# Altium footprint library ICs And Semiconductors SMD.PcbLib: 943 footprints (part 45 of 60)
Each footprint in its own frame and in the unit in brackets; x right, y up, seen from the top. Pads: shape width x height; smd on the part's side, far side on the other; paste and mask are expansions set on the pad; w line width, h text height; cw(c..) or ccw(c..) is an arc to the next point about the centre after c.
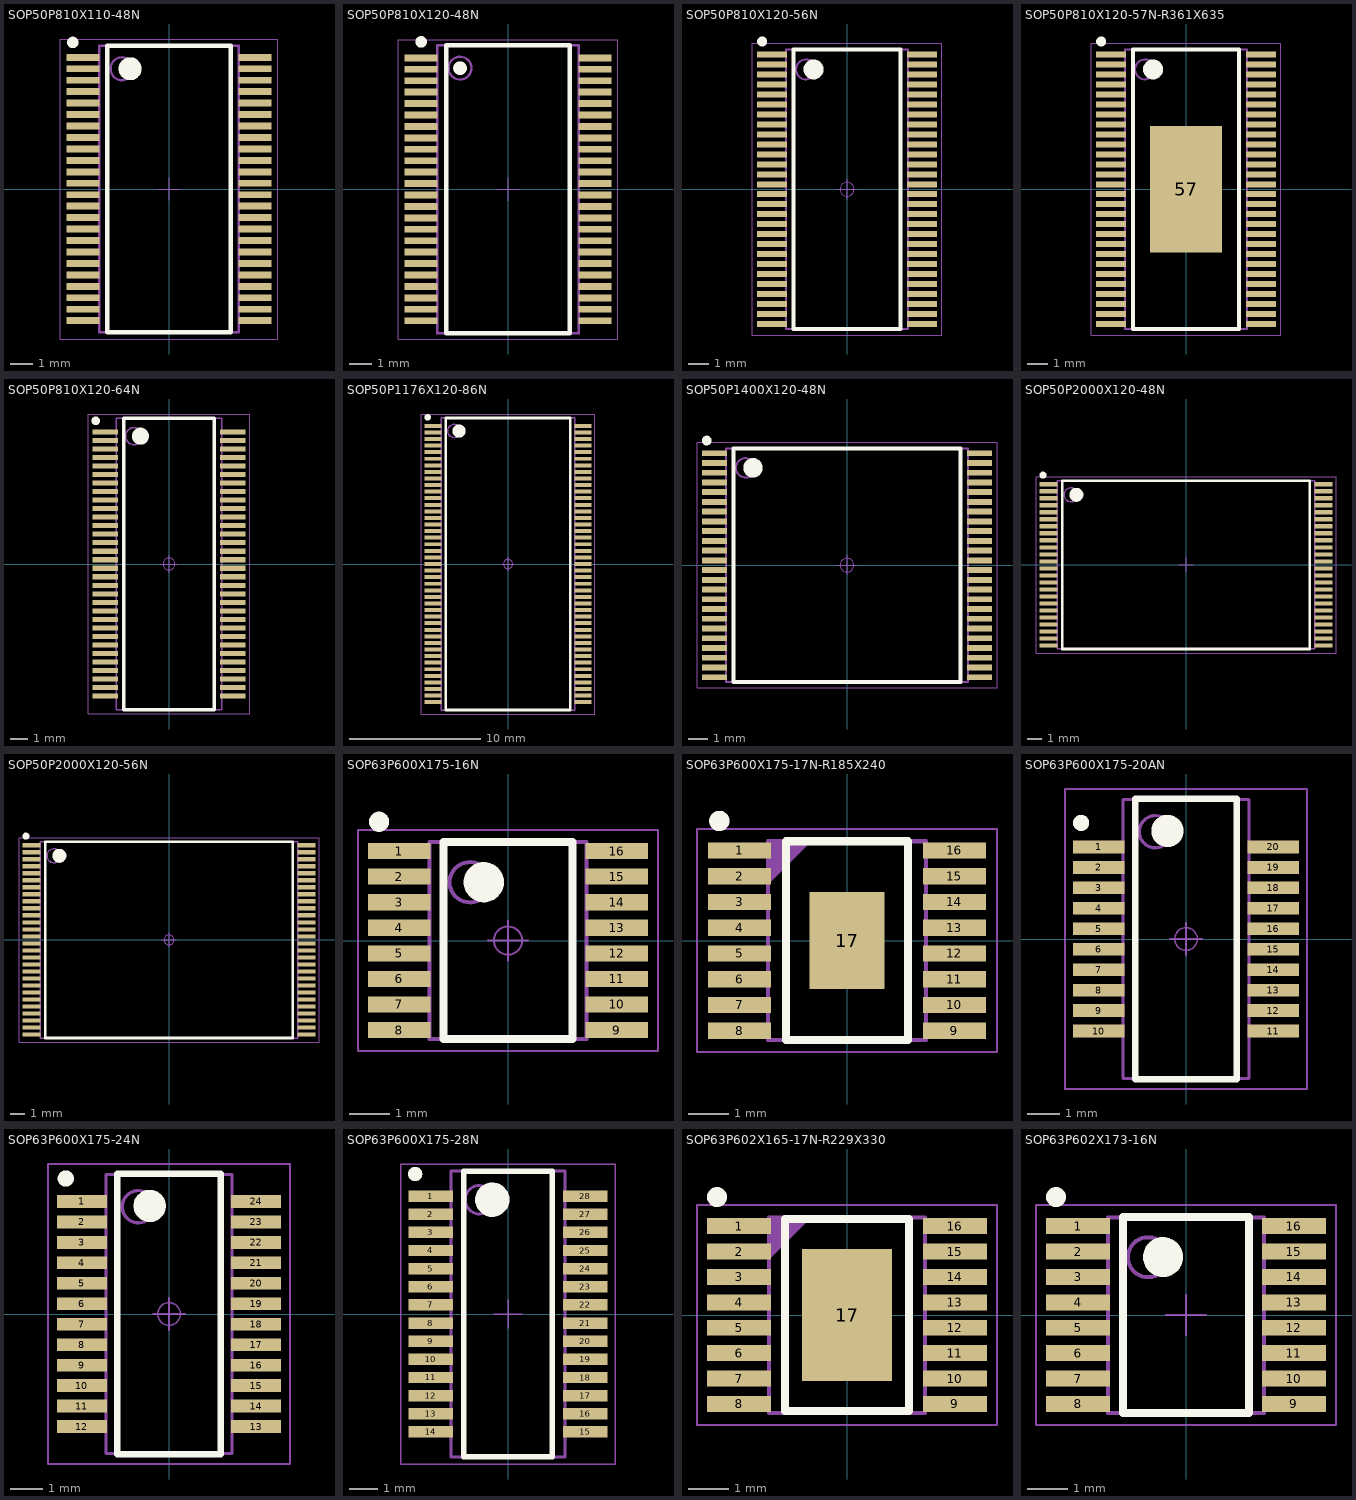
[diagram p44: the footprints below, top view; thin cyan lines are the x and y axes]

## SOP50P810X110-48N [mm] "SOP, 48-Leads, Body 12.5x6.2mm (max), Pitch 0.50mm, IPC Medium Density"
height 1.1
pads (48):
  rect 1.45x0.3 smd: 1(-3.75,5.75) 2(-3.75,5.25) 3(-3.75,4.75) 4(-3.75,4.25) 5(-3.75,3.75) 6(-3.75,3.25) 7(-3.75,2.75) 8(-3.75,2.25) 9(-3.75,1.75) 10(-3.75,1.25) 11(-3.75,0.75) 12(-3.75,0.25) 13(-3.75,-0.25) 14(-3.75,-0.75) 15(-3.75,-1.25) 16(-3.75,-1.75) 17(-3.75,-2.25) 18(-3.75,-2.75) 19(-3.75,-3.25) 20(-3.75,-3.75) 21(-3.75,-4.25) 22(-3.75,-4.75) 23(-3.75,-5.25) 24(-3.75,-5.75) 25(3.75,-5.75) 26(3.75,-5.25) 27(3.75,-4.75) 28(3.75,-4.25) 29(3.75,-3.75) 30(3.75,-3.25) 31(3.75,-2.75) 32(3.75,-2.25) 33(3.75,-1.75) 34(3.75,-1.25) 35(3.75,-0.75) 36(3.75,-0.25) 37(3.75,0.25) 38(3.75,0.75) 39(3.75,1.25) 40(3.75,1.75) 41(3.75,2.25) 42(3.75,2.75) 43(3.75,3.25) 44(3.75,3.75) 45(3.75,4.25) 46(3.75,4.75) 47(3.75,5.25) 48(3.75,5.75)
Top Overlay:
  circle w0.5: c-1.7,5.25 r0.25
  circle w0.25: c-4.2,6.4 r0.125
  lines w0.2: -2.7,-6.25 2.7,-6.25 2.7,6.25 -2.7,6.25 -2.7,-6.25
Mechanical 14:
  circle w0.1: c-2.05,5.25 r0.5
  lines w0.1: -3.05,-6.25 -3.05,6.25 3.05,6.25 3.05,-6.25 -3.05,-6.25
Mechanical 15:
  lines w0.05: -0.5,0 0.5,0 ; 0,-0.5 0,0.5 ; -4.75,-6.55 -4.75,6.55 4.75,6.55 4.75,-6.55 -4.75,-6.55
3D body "SOP50P810X110-48N.stp": height 1.1, standoff 0, extent -4.06,-6.3 4.061,6.3

## SOP50P810X120-48N [mm] "SOP, 48-Leads, Body 12.6x6.2mm (max), Pitch 0.50mm, IPC Medium Density"
height 1.2
pads (48):
  rect 1.45x0.3 smd: 1(-3.8,5.75) 2(-3.8,5.25) 3(-3.8,4.75) 4(-3.8,4.25) 5(-3.8,3.75) 6(-3.8,3.25) 7(-3.8,2.75) 8(-3.8,2.25) 9(-3.8,1.75) 10(-3.8,1.25) 11(-3.8,0.75) 12(-3.8,0.25) 13(-3.8,-0.25) 14(-3.8,-0.75) 15(-3.8,-1.25) 16(-3.8,-1.75) 17(-3.8,-2.25) 18(-3.8,-2.75) 19(-3.8,-3.25) 20(-3.8,-3.75) 21(-3.8,-4.25) 22(-3.8,-4.75) 23(-3.8,-5.25) 24(-3.8,-5.75) 25(3.8,-5.75) 26(3.8,-5.25) 27(3.8,-4.75) 28(3.8,-4.25) 29(3.8,-3.75) 30(3.8,-3.25) 31(3.8,-2.75) 32(3.8,-2.25) 33(3.8,-1.75) 34(3.8,-1.25) 35(3.8,-0.75) 36(3.8,-0.25) 37(3.8,0.25) 38(3.8,0.75) 39(3.8,1.25) 40(3.8,1.75) 41(3.8,2.25) 42(3.8,2.75) 43(3.8,3.25) 44(3.8,3.75) 45(3.8,4.25) 46(3.8,4.75) 47(3.8,5.25) 48(3.8,5.75)
Top Overlay:
  circle w0.3: c-2.1,5.3 r0.15
  circle w0.25: c-3.8,6.45 r0.125
  lines w0.2: -2.7,-6.3 -2.7,6.3 2.7,6.3 2.7,-6.3 -2.7,-6.3
Mechanical 14:
  circle w0.1: c-2.1,5.3 r0.5
  lines w0.1: -3.1,-6.3 -3.1,6.3 3.1,6.3 3.1,-6.3 -3.1,-6.3
Mechanical 15:
  lines w0.05: -0.5,0 0.5,0 ; 0,-0.5 0,0.5 ; -4.8,-6.55 -4.8,6.55 4.8,6.55 4.8,-6.55 -4.8,-6.55
3D body "SOP50P810X120-48N.stp": height 1.2, standoff 0, extent -4.06,-6.3 4.061,6.3

## SOP50P810X120-56N [mm] "SOP, 0.50mm Pitch; 56 Pin,6.10mm W X 14.00mm L X 1.20mm H Body, IPC Medium Density"
height 1.2
pads (56):
  rect 1.5x0.3 smd: 1(-3.75,6.75) 2(-3.75,6.25) 3(-3.75,5.75) 4(-3.75,5.25) 5(-3.75,4.75) 6(-3.75,4.25) 7(-3.75,3.75) 8(-3.75,3.25) 9(-3.75,2.75) 10(-3.75,2.25) 11(-3.75,1.75) 12(-3.75,1.25) 13(-3.75,0.75) 14(-3.75,0.25) 15(-3.75,-0.25) 16(-3.75,-0.75) 17(-3.75,-1.25) 18(-3.75,-1.75) 19(-3.75,-2.25) 20(-3.75,-2.75) 21(-3.75,-3.25) 22(-3.75,-3.75) 23(-3.75,-4.25) 24(-3.75,-4.75) 25(-3.75,-5.25) 26(-3.75,-5.75) 27(-3.75,-6.25) 28(-3.75,-6.75) 29(3.75,-6.75) 30(3.75,-6.25) 31(3.75,-5.75) 32(3.75,-5.25) 33(3.75,-4.75) 34(3.75,-4.25) 35(3.75,-3.75) 36(3.75,-3.25) 37(3.75,-2.75) 38(3.75,-2.25) 39(3.75,-1.75) 40(3.75,-1.25) 41(3.75,-0.75) 42(3.75,-0.25) 43(3.75,0.25) 44(3.75,0.75) 45(3.75,1.25) 46(3.75,1.75) 47(3.75,2.25) 48(3.75,2.75) 49(3.75,3.25) 50(3.75,3.75) 51(3.75,4.25) 52(3.75,4.75) 53(3.75,5.25) 54(3.75,5.75) 55(3.75,6.25) 56(3.75,6.75)
Top Overlay:
  circle w0.5: c-1.675,6 r0.25
  circle w0.25: c-4.25,7.4 r0.125
  lines w0.2: -2.675,-7 2.675,-7 2.675,7 -2.675,7 -2.675,-7
Mechanical 14:
  circle w0.1: c-2.05,6 r0.5
  lines w0.1: -3.05,-7 3.05,-7 3.05,7 -3.05,7 -3.05,-7
Mechanical 15:
  circle w0.05: c0,0 r0.35
  lines w0.05: -0.5,0 0.5,0 ; 0,-0.5 0,0.5 ; -4.75,-7.3 4.75,-7.3 4.75,7.3 -4.75,7.3 -4.75,-7.3
3D body "SOP50P810X120-56N.stp": height 1.2, standoff 0, extent -4.06,-7.05 4.061,7.05

## SOP50P810X120-57N-R361X635 [mm] "SOP, 0.50mm Pitch; 56 Pin,6.10mm W X 14.00mm L X 1.20mm H Body (w/Termal Tab  3.61 X 6.35mm), IPC Medium Density"
height 1.2
pads (57):
  rect 1.5x0.3 smd: 1(-3.75,6.75) 2(-3.75,6.25) 3(-3.75,5.75) 4(-3.75,5.25) 5(-3.75,4.75) 6(-3.75,4.25) 7(-3.75,3.75) 8(-3.75,3.25) 9(-3.75,2.75) 10(-3.75,2.25) 11(-3.75,1.75) 12(-3.75,1.25) 13(-3.75,0.75) 14(-3.75,0.25) 15(-3.75,-0.25) 16(-3.75,-0.75) 17(-3.75,-1.25) 18(-3.75,-1.75) 19(-3.75,-2.25) 20(-3.75,-2.75) 21(-3.75,-3.25) 22(-3.75,-3.75) 23(-3.75,-4.25) 24(-3.75,-4.75) 25(-3.75,-5.25) 26(-3.75,-5.75) 27(-3.75,-6.25) 28(-3.75,-6.75) 29(3.75,-6.75) 30(3.75,-6.25) 31(3.75,-5.75) 32(3.75,-5.25) 33(3.75,-4.75) 34(3.75,-4.25) 35(3.75,-3.75) 36(3.75,-3.25) 37(3.75,-2.75) 38(3.75,-2.25) 39(3.75,-1.75) 40(3.75,-1.25) 41(3.75,-0.75) 42(3.75,-0.25) 43(3.75,0.25) 44(3.75,0.75) 45(3.75,1.25) 46(3.75,1.75) 47(3.75,2.25) 48(3.75,2.75) 49(3.75,3.25) 50(3.75,3.75) 51(3.75,4.25) 52(3.75,4.75) 53(3.75,5.25) 54(3.75,5.75) 55(3.75,6.25) 56(3.75,6.75)
  rect 3.61x6.35 smd: 57(0,0)
Top Overlay:
  circle w0.25: c-4.25,7.4 r0.125
  circle w0.5: c-1.65,6 r0.25
  lines w0.2: -2.65,-7 2.65,-7 2.65,7 -2.65,7 -2.65,-7
Top Paste:
  region: -0.97,-2.62 0.97,-2.62 0.97,-0.28 -0.97,-0.28
  region: -0.97,0.28 0.97,0.28 0.97,2.62 -0.97,2.62
Mechanical 14:
  circle w0.1: c-2.05,6 r0.5
  lines w0.1: -3.05,-7 3.05,-7 3.05,7 -3.05,7 -3.05,-7
Mechanical 15:
  circle w0.05: c0,0 r0.35
  lines w0.05: -0.5,0 0.5,0 ; 0,-0.5 0,0.5 ; -4.75,-7.3 4.75,-7.3 4.75,7.3 -4.75,7.3 -4.75,-7.3
3D body "SOP50P810X120-57N-R361X635.stp": height 1.2, standoff 0, extent -4.06,-7.05 4.061,7.05

## SOP50P810X120-64N [mm] "SOP, 0.50mm Pitch; 64 Pin,6.10mm W X 17.00mm L X 1.20mm H Body, IPC Medium Density"
height 1.2
pads (64):
  rect 1.5x0.3 smd: 1(-3.75,7.75) 2(-3.75,7.25) 3(-3.75,6.75) 4(-3.75,6.25) 5(-3.75,5.75) 6(-3.75,5.25) 7(-3.75,4.75) 8(-3.75,4.25) 9(-3.75,3.75) 10(-3.75,3.25) 11(-3.75,2.75) 12(-3.75,2.25) 13(-3.75,1.75) 14(-3.75,1.25) 15(-3.75,0.75) 16(-3.75,0.25) 17(-3.75,-0.25) 18(-3.75,-0.75) 19(-3.75,-1.25) 20(-3.75,-1.75) 21(-3.75,-2.25) 22(-3.75,-2.75) 23(-3.75,-3.25) 24(-3.75,-3.75) 25(-3.75,-4.25) 26(-3.75,-4.75) 27(-3.75,-5.25) 28(-3.75,-5.75) 29(-3.75,-6.25) 30(-3.75,-6.75) 31(-3.75,-7.25) 32(-3.75,-7.75) 33(3.75,-7.75) 34(3.75,-7.25) 35(3.75,-6.75) 36(3.75,-6.25) 37(3.75,-5.75) 38(3.75,-5.25) 39(3.75,-4.75) 40(3.75,-4.25) 41(3.75,-3.75) 42(3.75,-3.25) 43(3.75,-2.75) 44(3.75,-2.25) 45(3.75,-1.75) 46(3.75,-1.25) 47(3.75,-0.75) 48(3.75,-0.25) 49(3.75,0.25) 50(3.75,0.75) 51(3.75,1.25) 52(3.75,1.75) 53(3.75,2.25) 54(3.75,2.75) 55(3.75,3.25) 56(3.75,3.75) 57(3.75,4.25) 58(3.75,4.75) 59(3.75,5.25) 60(3.75,5.75) 61(3.75,6.25) 62(3.75,6.75) 63(3.75,7.25) 64(3.75,7.75)
Top Overlay:
  circle w0.25: c-4.3,8.4 r0.125
  circle w0.5: c-1.675,7.5 r0.25
  lines w0.2: -2.65,-8.55 -2.65,8.55 2.65,8.55 2.65,-8.55 -2.65,-8.55
Mechanical 14:
  circle w0.1: c-2.05,7.5 r0.5
  lines w0.1: -3.1,-8.55 3.1,-8.55 3.1,8.55 -3.1,8.55 -3.1,-8.55
Mechanical 15:
  circle w0.05: c0,0 r0.35
  lines w0.05: -0.5,0 0.5,0 ; 0,-0.5 0,0.5 ; -4.75,-8.8 4.75,-8.8 4.75,8.8 -4.75,8.8 -4.75,-8.8
3D body "SOP50P810X120-64N.stp": height 1.2, standoff 0, extent -4.06,-8.55 4.061,8.55

## SOP50P1176X120-86N [mm] "SOP, 0.50mm, pitch; 86 pin, 10.16mm W X 22.22mm L X 1.20mm H body, IPC Medium Density"
height 1.2
pads (86):
  rect 1.3x0.3 smd: 1(-5.7,10.5) 2(-5.7,10) 3(-5.7,9.5) 4(-5.7,9) 5(-5.7,8.5) 6(-5.7,8) 7(-5.7,7.5) 8(-5.7,7) 9(-5.7,6.5) 10(-5.7,6) 11(-5.7,5.5) 12(-5.7,5) 13(-5.7,4.5) 14(-5.7,4) 15(-5.7,3.5) 16(-5.7,3) 17(-5.7,2.5) 18(-5.7,2) 19(-5.7,1.5) 20(-5.7,1) 21(-5.7,0.5) 22(-5.7,0) 23(-5.7,-0.5) 24(-5.7,-1) 25(-5.7,-1.5) 26(-5.7,-2) 27(-5.7,-2.5) 28(-5.7,-3) 29(-5.7,-3.5) 30(-5.7,-4) 31(-5.7,-4.5) 32(-5.7,-5) 33(-5.7,-5.5) 34(-5.7,-6) 35(-5.7,-6.5) 36(-5.7,-7) 37(-5.7,-7.5) 38(-5.7,-8) 39(-5.7,-8.5) 40(-5.7,-9) 41(-5.7,-9.5) 42(-5.7,-10) 43(-5.7,-10.5) 44(5.7,-10.5) 45(5.7,-10) 46(5.7,-9.5) 47(5.7,-9) 48(5.7,-8.5) 49(5.7,-8) 50(5.7,-7.5) 51(5.7,-7) 52(5.7,-6.5) 53(5.7,-6) 54(5.7,-5.5) 55(5.7,-5) 56(5.7,-4.5) 57(5.7,-4) 58(5.7,-3.5) 59(5.7,-3) 60(5.7,-2.5) 61(5.7,-2) 62(5.7,-1.5) 63(5.7,-1) 64(5.7,-0.5) 65(5.7,0) 66(5.7,0.5) 67(5.7,1) 68(5.7,1.5) 69(5.7,2) 70(5.7,2.5) 71(5.7,3) 72(5.7,3.5) 73(5.7,4) 74(5.7,4.5) 75(5.7,5) 76(5.7,5.5) 77(5.7,6) 78(5.7,6.5) 79(5.7,7) 80(5.7,7.5) 81(5.7,8) 82(5.7,8.5) 83(5.7,9) 84(5.7,9.5) 85(5.7,10) 86(5.7,10.5)
Top Overlay:
  circle w0.5: c-3.725,10.1 r0.25
  circle w0.25: c-6.1,11.15 r0.125
  lines w0.2: -4.725,-11.1 4.725,-11.1 4.725,11.1 -4.725,11.1 -4.725,-11.1
Mechanical 14:
  circle w0.1: c-4.08,10.11 r0.5
  lines w0.1: -5.08,-11.11 5.08,-11.11 5.08,11.11 -5.08,11.11 -5.08,-11.11
Mechanical 15:
  circle w0.05: c0,0 r0.35
  lines w0.05: -0.5,0 0.5,0 ; 0,-0.5 0,0.5 ; -6.6,-11.4 6.6,-11.4 6.6,11.4 -6.6,11.4 -6.6,-11.4
3D body "SOP50P1176X120-86N.stp": height 1.2, standoff 0, extent -5.97,-11.15 5.97,11.15

## SOP50P1400X120-48N [mm] "SOP, 0.50mm Pitch; 48 Pin, 12.40mm W X 12.00mm L X 1.20mm H body, IPC Medium Density"
height 1.2
pads (48):
  rect 1.3x0.3 smd: 1(-6.8,5.75) 2(-6.8,5.25) 3(-6.8,4.75) 4(-6.8,4.25) 5(-6.8,3.75) 6(-6.8,3.25) 7(-6.8,2.75) 8(-6.8,2.25) 9(-6.8,1.75) 10(-6.8,1.25) 11(-6.8,0.75) 12(-6.8,0.25) 13(-6.8,-0.25) 14(-6.8,-0.75) 15(-6.8,-1.25) 16(-6.8,-1.75) 17(-6.8,-2.25) 18(-6.8,-2.75) 19(-6.8,-3.25) 20(-6.8,-3.75) 21(-6.8,-4.25) 22(-6.8,-4.75) 23(-6.8,-5.25) 24(-6.8,-5.75) 25(6.8,-5.75) 26(6.8,-5.25) 27(6.8,-4.75) 28(6.8,-4.25) 29(6.8,-3.75) 30(6.8,-3.25) 31(6.8,-2.75) 32(6.8,-2.25) 33(6.8,-1.75) 34(6.8,-1.25) 35(6.8,-0.75) 36(6.8,-0.25) 37(6.8,0.25) 38(6.8,0.75) 39(6.8,1.25) 40(6.8,1.75) 41(6.8,2.25) 42(6.8,2.75) 43(6.8,3.25) 44(6.8,3.75) 45(6.8,4.25) 46(6.8,4.75) 47(6.8,5.25) 48(6.8,5.75)
Top Overlay:
  circle w0.5: c-4.825,5 r0.25
  circle w0.25: c-7.2,6.4 r0.125
  lines w0.2: -5.825,-6 5.825,-6 5.825,6 -5.825,6 -5.825,-6
Mechanical 14:
  circle w0.1: c-5.2,5 r0.5
  lines w0.1: -6.2,-6 6.2,-6 6.2,6 -6.2,6 -6.2,-6
Mechanical 15:
  circle w0.05: c0,0 r0.35
  lines w0.05: -0.5,0 0.5,0 ; 0,-0.5 0,0.5 ; -7.7,-6.3 7.7,-6.3 7.7,6.3 -7.7,6.3 -7.7,-6.3
3D body "SOP50P1400X120-48N.stp": height 1.2, standoff 0, extent -7.061,-6 7.061,6

## SOP50P2000X120-48N [mm] "SOP, 48-Leads, Body 18.45x12mm, Pitch 0.50mm, IPC Medium Density"
height 1.2
pads (48):
  rect 1.3x0.3 smd: 1(-9.8,5.75) 2(-9.8,5.25) 3(-9.8,4.75) 4(-9.8,4.25) 5(-9.8,3.75) 6(-9.8,3.25) 7(-9.8,2.75) 8(-9.8,2.25) 9(-9.8,1.75) 10(-9.8,1.25) 11(-9.8,0.75) 12(-9.8,0.25) 13(-9.8,-0.25) 14(-9.8,-0.75) 15(-9.8,-1.25) 16(-9.8,-1.75) 17(-9.8,-2.25) 18(-9.8,-2.75) 19(-9.8,-3.25) 20(-9.8,-3.75) 21(-9.8,-4.25) 22(-9.8,-4.75) 23(-9.8,-5.25) 24(-9.8,-5.75) 25(9.8,-5.75) 26(9.8,-5.25) 27(9.8,-4.75) 28(9.8,-4.25) 29(9.8,-3.75) 30(9.8,-3.25) 31(9.8,-2.75) 32(9.8,-2.25) 33(9.8,-1.75) 34(9.8,-1.25) 35(9.8,-0.75) 36(9.8,-0.25) 37(9.8,0.25) 38(9.8,0.75) 39(9.8,1.25) 40(9.8,1.75) 41(9.8,2.25) 42(9.8,2.75) 43(9.8,3.25) 44(9.8,3.75) 45(9.8,4.25) 46(9.8,4.75) 47(9.8,5.25) 48(9.8,5.75)
Top Overlay:
  circle w0.25: c-10.2,6.4 r0.125
  circle w0.5: c-7.825,5 r0.25
  lines w0.2: -8.825,-6 -8.825,6 8.825,6 8.825,-6 -8.825,-6
Mechanical 14:
  circle w0.1: c-8.2,5 r0.5
  lines w0.1: -9.2,-6 9.2,-6 9.2,6 -9.2,6 -9.2,-6
Mechanical 15:
  lines w0.05: -0.5,0 0.5,0 ; 0,-0.5 0,0.5 ; -10.7,-6.3 10.7,-6.3 10.7,6.3 -10.7,6.3 -10.7,-6.3
3D body "SOP50P2000X120-48N.stp": height 1.2, standoff 0, extent -10.12,-6.05 10.121,6.05

## SOP50P2000X120-56N [mm] "SOP, 0.50mm, Pitch; 56 Pin, 18.40mm W X 14.00mm L X 1.20mm H body, IPC Medium Density"
height 1.2
pads (56):
  rect 1.3x0.3 smd: 1(-9.8,6.75) 2(-9.8,6.25) 3(-9.8,5.75) 4(-9.8,5.25) 5(-9.8,4.75) 6(-9.8,4.25) 7(-9.8,3.75) 8(-9.8,3.25) 9(-9.8,2.75) 10(-9.8,2.25) 11(-9.8,1.75) 12(-9.8,1.25) 13(-9.8,0.75) 14(-9.8,0.25) 15(-9.8,-0.25) 16(-9.8,-0.75) 17(-9.8,-1.25) 18(-9.8,-1.75) 19(-9.8,-2.25) 20(-9.8,-2.75) 21(-9.8,-3.25) 22(-9.8,-3.75) 23(-9.8,-4.25) 24(-9.8,-4.75) 25(-9.8,-5.25) 26(-9.8,-5.75) 27(-9.8,-6.25) 28(-9.8,-6.75) 29(9.8,-6.75) 30(9.8,-6.25) 31(9.8,-5.75) 32(9.8,-5.25) 33(9.8,-4.75) 34(9.8,-4.25) 35(9.8,-3.75) 36(9.8,-3.25) 37(9.8,-2.75) 38(9.8,-2.25) 39(9.8,-1.75) 40(9.8,-1.25) 41(9.8,-0.75) 42(9.8,-0.25) 43(9.8,0.25) 44(9.8,0.75) 45(9.8,1.25) 46(9.8,1.75) 47(9.8,2.25) 48(9.8,2.75) 49(9.8,3.25) 50(9.8,3.75) 51(9.8,4.25) 52(9.8,4.75) 53(9.8,5.25) 54(9.8,5.75) 55(9.8,6.25) 56(9.8,6.75)
Top Overlay:
  circle w0.25: c-10.2,7.4 r0.125
  circle w0.5: c-7.825,6 r0.25
  lines w0.2: -8.825,-7 -8.825,7 8.825,7 8.825,-7 -8.825,-7
Mechanical 14:
  circle w0.1: c-8.2,6 r0.5
  lines w0.1: -9.2,-7 -9.2,7 9.2,7 9.2,-7 -9.2,-7
Mechanical 15:
  circle w0.05: c0,0 r0.35
  lines w0.05: -0.5,0 0.5,0 ; 0,-0.5 0,0.5 ; -10.7,-7.3 -10.7,7.3 10.7,7.3 10.7,-7.3 -10.7,-7.3
3D body "SOP50P2000X120-56N.stp": height 1.2, standoff 0, extent -10.12,-7.05 10.121,7.05

## SOP63P600X175-16N [mm] "SOP, 0.635mm pitch; 16 pin, 3.9mm W X 4.895mm L X 1.75mm H Body, IPC Medium Density"
height 1.75
pads (16):
  rect 1.55x0.4 smd: 1(-2.7,2.222) 2(-2.7,1.587) 3(-2.7,0.953) 4(-2.7,0.318) 5(-2.7,-0.318) 6(-2.7,-0.953) 7(-2.7,-1.587) 8(-2.7,-2.222) 9(2.7,-2.222) 10(2.7,-1.587) 11(2.7,-0.953) 12(2.7,-0.318) 13(2.7,0.318) 14(2.7,0.953) 15(2.7,1.587) 16(2.7,2.222)
Top Overlay:
  circle w0.25: c-3.2,2.95 r0.125
  circle w0.5: c-0.6,1.45 r0.25
  lines w0.2: -1.6,-2.45 -1.6,2.45 1.6,2.45 1.6,-2.45 -1.6,-2.45
Mechanical 14:
  circle w0.1: c-0.95,1.448 r0.5
  lines w0.1: -1.95,-2.448 -1.95,2.448 1.95,2.448 1.95,-2.448 -1.95,-2.448
Mechanical 15:
  circle w0.05: c0,0 r0.35
  lines w0.05: -0.5,0 0.5,0 ; 0,-0.5 0,0.5 ; -3.725,-2.745 -3.725,2.745 3.725,2.745 3.725,-2.745 -3.725,-2.745
3D body "SOP63P600X175-16N.stp": height 1.75, standoff 0, extent -3.127,-2.49 3.127,2.49

## SOP63P600X175-17N-R185X240 [mm] "SOP,0.635mm,pitch;16 pin,3.90mm W X 4.90mm L X 1.75mm H body (w/thermal tab 1.8mm X 2.4 mm), IPC Medium Density"
height 1.75
pads (17):
  rect 1.55x0.4 smd: 1(-2.65,2.222) 2(-2.65,1.587) 3(-2.65,0.953) 4(-2.65,0.318) 5(-2.65,-0.318) 6(-2.65,-0.953) 7(-2.65,-1.587) 8(-2.65,-2.222) 9(2.65,-2.222) 10(2.65,-1.587) 11(2.65,-0.953) 12(2.65,-0.318) 13(2.65,0.318) 14(2.65,0.953) 15(2.65,1.587) 16(2.65,2.222)
  rect 1.85x2.4 smd: 17(0,0)
Top Overlay:
  circle w0.25: c-3.15,2.95 r0.125
  lines w0.2: -1.5,-2.45 -1.5,2.45 1.5,2.45 1.5,-2.45 -1.5,-2.45
Mechanical 14:
  lines w0.1: -1.95,1.45 -0.95,2.45 ; -1.95,1.55 -1.05,2.45 ; -1.95,1.65 -1.15,2.45 ; -1.95,1.75 -1.25,2.45 ; -1.95,1.85 -1.35,2.45 ; -1.95,1.95 -1.45,2.45 ; -1.95,2.05 -1.55,2.45 ; -1.95,2.15 -1.65,2.45 ; -1.95,2.25 -1.75,2.45 ; -1.95,2.35 -1.85,2.45 ; -1.95,-2.45 -1.95,2.45 1.95,2.45 1.95,-2.45 -1.95,-2.45
Mechanical 15:
  circle w0.05: c0,0 r0.35
  lines w0.05: -0.5,0 0.5,0 ; 0,-0.5 0,0.5 ; -3.7,-2.75 -3.7,2.75 3.7,2.75 3.7,-2.75 -3.7,-2.75
3D body "SOP63P600X175-17N-R185X240.stp": height 1.75, standoff 0, extent -3.127,-2.49 3.127,2.49

## SOP63P600X175-20AN [mm] "SOP, 0.635mm Pitch; 20 Pin, 3.90mm W X 8.65mm L X 1.75mm H Body, IPC Medium Density"
height 1.75
pads (20):
  rect 1.6x0.4 smd: 1(-2.7,2.857) 2(-2.7,2.222) 3(-2.7,1.587) 4(-2.7,0.953) 5(-2.7,0.318) 6(-2.7,-0.318) 7(-2.7,-0.953) 8(-2.7,-1.587) 9(-2.7,-2.222) 10(-2.7,-2.857) 11(2.7,-2.857) 12(2.7,-2.222) 13(2.7,-1.587) 14(2.7,-0.953) 15(2.7,-0.318) 16(2.7,0.318) 17(2.7,0.953) 18(2.7,1.587) 19(2.7,2.222) 20(2.7,2.857)
Top Overlay:
  circle w0.5: c-0.575,3.35 r0.25
  circle w0.25: c-3.25,3.6 r0.125
  lines w0.2: -1.575,-4.35 1.575,-4.35 1.575,4.35 -1.575,4.35 -1.575,-4.35
Mechanical 14:
  circle w0.1: c-0.95,3.325 r0.5
  lines w0.1: -1.95,-4.325 1.95,-4.325 1.95,4.325 -1.95,4.325 -1.95,-4.325
Mechanical 15:
  circle w0.05: c0,0 r0.35
  lines w0.05: -0.5,0 0.5,0 ; 0,-0.5 0,0.5 ; -3.75,-4.65 3.75,-4.65 3.75,4.65 -3.75,4.65 -3.75,-4.65
3D body "SOP63P600X175-20AN.stp": height 1.75, standoff 0, extent -3.127,-4.37 3.127,4.37

## SOP63P600X175-24N [mm] "SOP, 0.635mm Pitch; 24 Pin, 3.90mm W X 8.65mm L X 1.75mm H Body, IPC Medium Density"
height 1.75
pads (24):
  rect 1.55x0.4 smd: 1(-2.7,3.492) 2(-2.7,2.857) 3(-2.7,2.222) 4(-2.7,1.587) 5(-2.7,0.953) 6(-2.7,0.318) 7(-2.7,-0.318) 8(-2.7,-0.953) 9(-2.7,-1.587) 10(-2.7,-2.222) 11(-2.7,-2.857) 12(-2.7,-3.492) 13(2.7,-3.492) 14(2.7,-2.857) 15(2.7,-2.222) 16(2.7,-1.587) 17(2.7,-0.953) 18(2.7,-0.318) 19(2.7,0.318) 20(2.7,0.953) 21(2.7,1.587) 22(2.7,2.222) 23(2.7,2.857) 24(2.7,3.492)
Top Overlay:
  circle w0.25: c-3.2,4.2 r0.125
  circle w0.5: c-0.6,3.35 r0.25
  lines w0.2: -1.6,-4.35 -1.6,4.35 1.6,4.35 1.6,-4.35 -1.6,-4.35
Mechanical 14:
  circle w0.1: c-0.95,3.325 r0.5
  lines w0.1: -1.95,-4.325 -1.95,4.325 1.95,4.325 1.95,-4.325 -1.95,-4.325
Mechanical 15:
  circle w0.05: c0,0 r0.35
  lines w0.05: -0.5,0 0.5,0 ; 0,-0.5 0,0.5 ; -3.75,-4.65 -3.75,4.65 3.75,4.65 3.75,-4.65 -3.75,-4.65
3D body "SOP63P600X175-24N.stp": height 1.75, standoff 0, extent -3.127,-4.37 3.127,4.37

## SOP63P600X175-28N [mm] "SOP, 0.635mm pitch, 28 pin,3.99mm W X 10.00mm L X 1.75mm H body, IPC Medium Density"
height 1.75
pads (28):
  rect 1.55x0.4 smd: 1(-2.7,4.128) 2(-2.7,3.493) 3(-2.7,2.858) 4(-2.7,2.223) 5(-2.7,1.588) 6(-2.7,0.953) 7(-2.7,0.318) 8(-2.7,-0.317) 9(-2.7,-0.952) 10(-2.7,-1.587) 11(-2.7,-2.222) 12(-2.7,-2.857) 13(-2.7,-3.492) 14(-2.7,-4.127) 15(2.7,-4.128) 16(2.7,-3.493) 17(2.7,-2.858) 18(2.7,-2.223) 19(2.7,-1.588) 20(2.7,-0.953) 21(2.7,-0.318) 22(2.7,0.317) 23(2.7,0.952) 24(2.7,1.587) 25(2.7,2.222) 26(2.7,2.857) 27(2.7,3.492) 28(2.7,4.127)
Top Overlay:
  circle w0.25: c-3.25,4.9 r0.125
  circle w0.6: c-0.55,4 r0.3
  lines w0.2: -1.55,-5 1.55,-5 1.55,5 -1.55,5 -1.55,-5
Mechanical 14:
  circle w0.1: c-0.995,4 r0.5
  lines w0.1: -1.995,-5 1.995,-5 1.995,5 -1.995,5 -1.995,-5
Mechanical 15:
  lines w0.05: -0.5,0 0.5,0 ; 0,-0.5 0,0.5 ; -3.75,-5.25 3.75,-5.25 3.75,5.25 -3.75,5.25 -3.75,-5.25
3D body "SOP63P600X175-28N.stp": height 1.75, standoff 0, extent -3.127,-5 3.127,5

## SOP63P602X165-17N-R229X330 [mm] "SOP, 0.635mm Pitch; 16 Pin, 3.90mm W X 4.89mm L X 1.65mm H body (w/thermal tab 2.29mm X 3.3mm), IPC Medium Density"
height 1.65
pads (17):
  rect 1.6x0.4 smd: 1(-2.7,2.222) 2(-2.7,1.587) 3(-2.7,0.953) 4(-2.7,0.318) 5(-2.7,-0.318) 6(-2.7,-0.953) 7(-2.7,-1.587) 8(-2.7,-2.222) 9(2.7,-2.222) 10(2.7,-1.587) 11(2.7,-0.953) 12(2.7,-0.318) 13(2.7,0.318) 14(2.7,0.953) 15(2.7,1.587) 16(2.7,2.222)
  rect 2.25x3.3 smd: 17(0,0)
Top Overlay:
  circle w0.25: c-3.25,2.95 r0.125
  lines w0.2: -1.55,-2.4 1.55,-2.4 1.55,2.4 -1.55,2.4 -1.55,-2.4
Mechanical 14:
  lines w0.1: -1.95,1.445 -0.95,2.445 ; -1.95,1.545 -1.05,2.445 ; -1.95,1.645 -1.15,2.445 ; -1.95,1.745 -1.25,2.445 ; -1.95,1.845 -1.35,2.445 ; -1.95,1.945 -1.45,2.445 ; -1.95,2.045 -1.55,2.445 ; -1.95,2.145 -1.65,2.445 ; -1.95,2.245 -1.75,2.445 ; -1.95,2.345 -1.85,2.445 ; -1.95,-2.445 1.95,-2.445 1.95,2.445 -1.95,2.445 -1.95,-2.445
Mechanical 15:
  circle w0.05: c0,0 r0.35
  lines w0.05: -0.5,0 0.5,0 ; 0,-0.5 0,0.5 ; -3.75,-2.75 3.75,-2.75 3.75,2.75 -3.75,2.75 -3.75,-2.75
3D body "SOP63P602X165-17N-R229X330.stp": height 1.65, standoff 0, extent -3.127,-2.49 3.127,2.49

## SOP63P602X173-16N [mm] "SOP, 0.635mm pitch; 16 pin, 3.9mm W X 4.89mm L body, IPC Medium Density"
height 1.73
pads (16):
  rect 1.6x0.4 smd: 1(-2.7,2.222) 2(-2.7,1.587) 3(-2.7,0.953) 4(-2.7,0.318) 5(-2.7,-0.318) 6(-2.7,-0.953) 7(-2.7,-1.587) 8(-2.7,-2.222) 9(2.7,-2.222) 10(2.7,-1.587) 11(2.7,-0.953) 12(2.7,-0.318) 13(2.7,0.318) 14(2.7,0.953) 15(2.7,1.587) 16(2.7,2.222)
Top Overlay:
  circle w0.25: c-3.25,2.95 r0.125
  circle w0.5: c-0.575,1.45 r0.25
  lines w0.2: -1.575,-2.45 -1.575,2.45 1.575,2.45 1.575,-2.45 -1.575,-2.45
Mechanical 14:
  circle w0.1: c-0.95,1.445 r0.5
  lines w0.1: -1.95,-2.445 -1.95,2.445 1.95,2.445 1.95,-2.445 -1.95,-2.445
Mechanical 15:
  lines w0.05: -0.5,0 0.5,0 ; 0,-0.5 0,0.5 ; -3.75,-2.75 -3.75,2.75 3.75,2.75 3.75,-2.75 -3.75,-2.75
3D body "SOP63P602X173-16N.stp": height 1.73, standoff 0, extent -3.127,-2.49 3.127,2.49